# Altium footprint library PCB1.PcbLib: 98 footprints (part 6 of 7)
Each footprint in its own frame and in the unit in brackets; x right, y up, seen from the top. Pads: shape width x height; smd on the part's side, far side on the other; paste and mask are expansions set on the pad; w line width, h text height; cw(c..) or ccw(c..) is an arc to the next point about the centre after c.
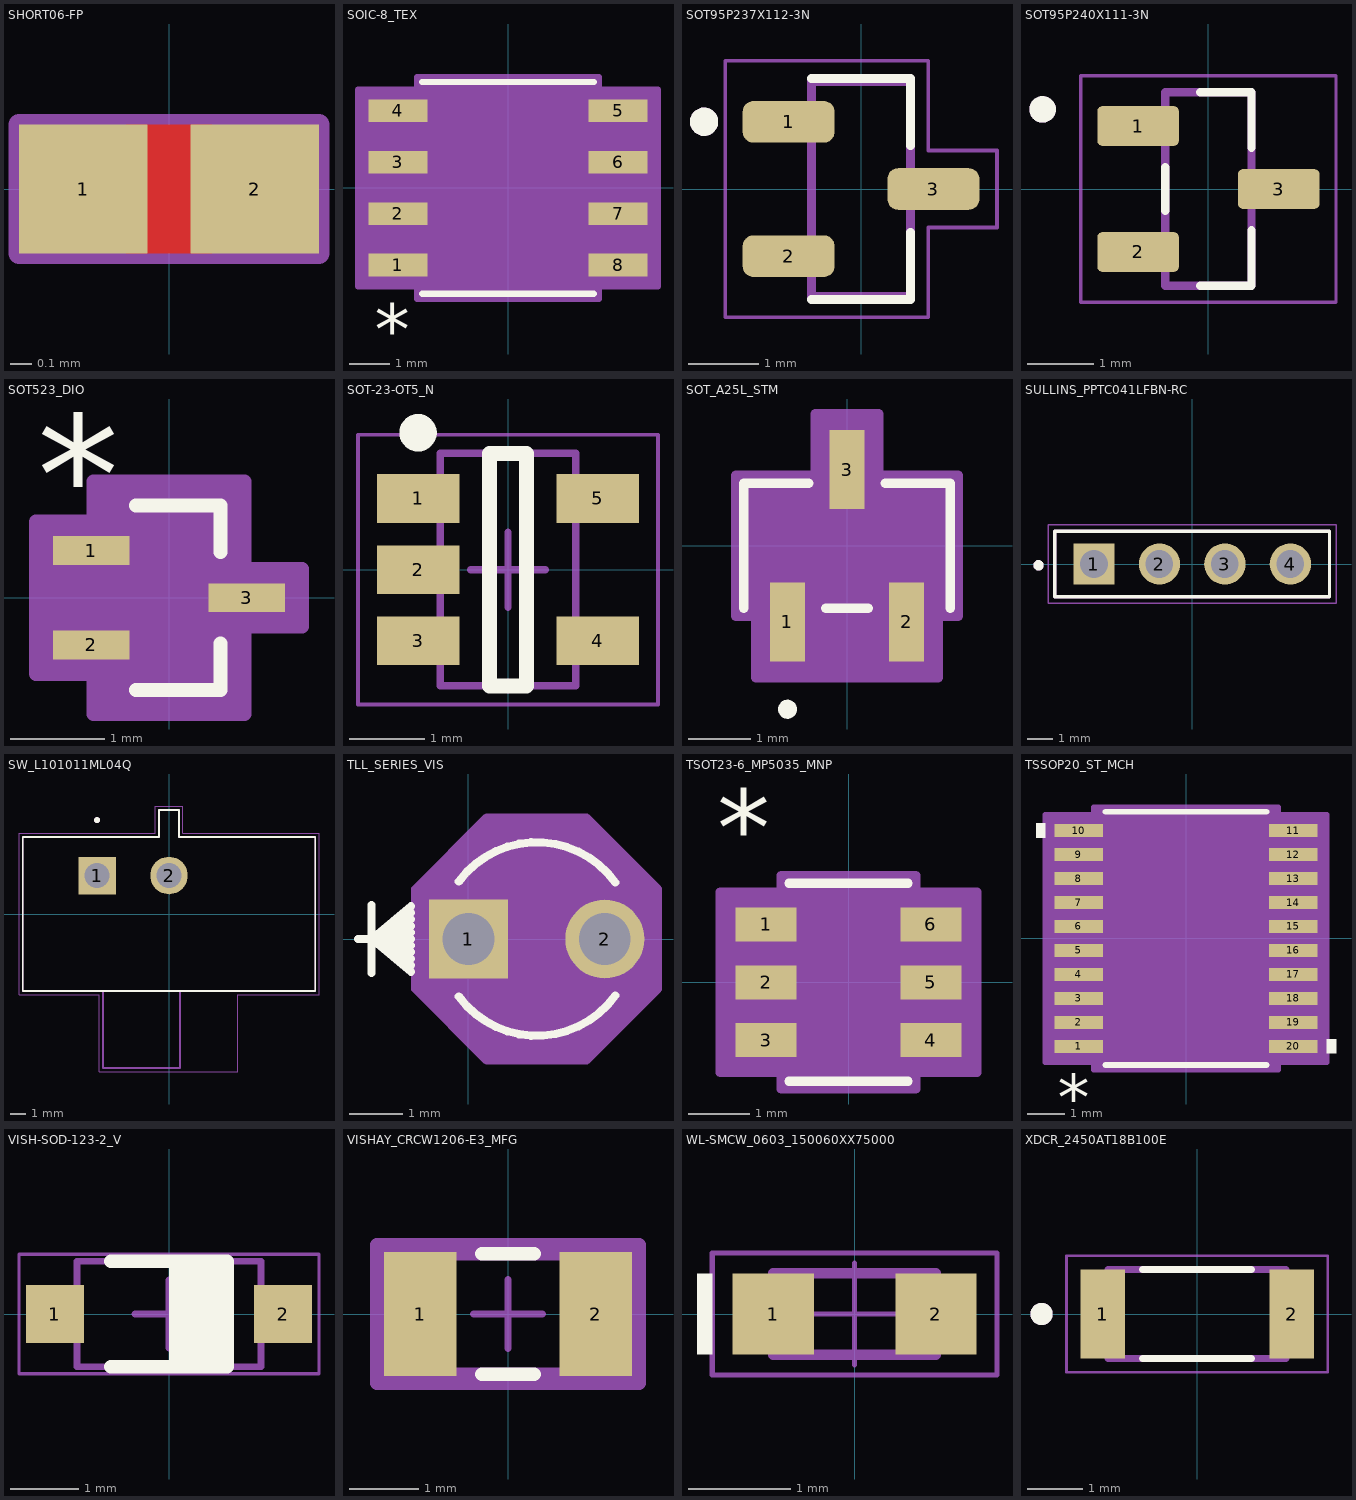
[diagram p5: the footprints below, top view; thin cyan lines are the x and y axes]

## SHORT06-FP [mm]
pads (2):
  rect 0.6x0.6 smd paste-0.4 mask+0.102: 1(-0.4,0) 2(0.4,0)
Top Layer:
  region: -0.2,0.3 -0.2,-0.3 0.2,-0.3 0.2,0.3
Top Assembly:
  lines w0.1: -0.7,-0.3 0.7,-0.3 0.7,0.3 -0.7,0.3 -0.7,-0.3

## SOIC-8_TEX [mil]
pads (8):
  rect 57.5x22 smd paste+0 mask+0: 1(-107.25,-75) 2(-107.25,-25) 3(-107.25,25) 4(-107.25,75) 5(107.25,75) 6(107.25,25) 7(107.25,-25) 8(107.25,-75)
Top Overlay:
  lines w6: -83.5,-103 83.5,-103 ; -83.5,103 83.5,103
  text "*" at -129.75,-92 h50
Top 3D Body:
  lines w0: -12,-98 cw(c0,-98) 12,-98
  lines w1: -122,-85 -78.5,-85 -78.5,-65 -122,-65 -122,-85 ; -122,-35 -78.5,-35 -78.5,-15 -122,-15 -122,-35 ; -122,15 -78.5,15 -78.5,35 -122,35 -122,15 ; -122,65 -78.5,65 -78.5,85 -122,85 -122,65 ; -78.5,-98 78.5,-98 78.5,98 -78.5,98 -78.5,-98 ; 78.5,-85 78.5,-65 122,-65 122,-85 78.5,-85 ; 78.5,-35 78.5,-15 122,-15 122,-35 78.5,-35 ; 78.5,15 78.5,35 122,35 122,15 78.5,15 ; 78.5,65 78.5,85 122,85 122,65 78.5,65
Top Courtyard:
  region: -88.5,96 -146,96 -146,-96 -88.5,-96 -88.5,-108 88.5,-108 88.5,-96 146,-96 146,96 88.5,96 88.5,108 -88.5,108
  lines w6: -146,-96 -146,96 -88.5,96 -88.5,108 88.5,108 88.5,96 146,96 146,-96 88.5,-96 88.5,-108 -88.5,-108 -88.5,-96 -146,-96
3D body "SOIC-8_TEX.step": height 69.09, standoff 0, extent -122.01,-97.99 122.01,97.99

## SOT95P237X112-3N [mm]
pads (3):
  rrect50% 1.3x0.59 smd: 1(-1.025,0.95) 2(-1.025,-0.95) 3(1.025,0)
Top Overlay:
  circle w0.2: c-2.222,0.953 r0.1
  lines w0.127: -0.7,-1.565 0.7,-1.565 0.7,-0.615 ; -0.7,1.565 0.7,1.565 0.7,0.615
Top 3D Body:
  circle w0.2: c-2.222,0.953 r0.1
  lines w0.127: -0.7,-1.52 -0.7,1.52 0.7,1.52 0.7,-1.52 -0.7,-1.52
Top Courtyard:
  lines w0.05: -1.925,-1.815 0.95,-1.815 0.95,-0.545 1.925,-0.545 1.925,0.545 0.95,0.545 0.95,1.815 -1.925,1.815 -1.925,-1.815
3D body "step_temp.STEP": height 1.12, standoff 0, extent -1.255,-1.46 1.255,1.46

## SOT95P240X111-3N [mm]
pads (3):
  rrect25% 1.23x0.6 smd paste+0 mask+0.102: 1(-1.06,0.95) 2(-1.06,-0.95) 3(1.06,0)
Top Overlay:
  circle w0.2: c-2.5,1.2 r0.1
  lines w0.127: -0.65,-0.33 -0.65,0.33 ; -0.125,-1.46 0.65,-1.46 0.65,-0.62 ; -0.125,1.46 0.65,1.46 0.65,0.62
Top 3D Body:
  circle w0.2: c-2.5,1.2 r0.1
  lines w0.127: -0.65,-1.46 -0.65,1.46 0.65,1.46 0.65,-1.46 -0.65,-1.46
Top Courtyard:
  lines w0.05: -1.925,-1.71 1.925,-1.71 1.925,1.71 -1.925,1.71 -1.925,-1.71
3D body "step_temp.STEP": height 1.2, standoff -0.1, extent -1.3,-1.516 1.3,1.524

## SOT523_DIO [mil]
pads (3):
  rect 32x12 smd paste+0 mask+0: 1(-32.5,19.68) 2(-32.5,-19.68) 3(32.5,0)
Top Overlay:
  lines w6: -13.78,-38.5 21.5,-38.5 21.5,-19.1 ; -13.78,38.5 21.5,38.5 21.5,19.1
  text "*" at -55,26.68 h50
Top 3D Body:
  lines w1: -12,33.5 ccw(c0,33.5) 12,33.5 ; -34.5,-25.68 -34.5,-13.69 -16.5,-13.69 -16.5,-25.68 -34.5,-25.68 ; -34.5,13.69 -34.5,25.68 -16.5,25.68 -16.5,13.69 -34.5,13.69 ; -16.5,-33.5 16.5,-33.5 16.5,33.5 -16.5,33.5 -16.5,-33.5 ; 16.5,-6 16.5,6 34.5,6 34.5,-6 16.5,-6
Top Courtyard:
  region: 31.5,-48.5 -31.5,-48.5 -31.5,-31.68 -55.5,-31.68 -55.5,31.68 -31.5,31.68 -31.5,48.5 31.5,48.5 31.5,12 55.5,12 55.5,-12 31.5,-12
  lines w6: -55.5,-31.68 -31.5,-31.68 -31.5,-48.5 31.5,-48.5 31.5,-12 55.5,-12 55.5,12 31.5,12 31.5,48.5 -31.5,48.5 -31.5,31.68 -55.5,31.68 -55.5,-31.68
3D body "SOT523_DIO.step": height 35.12, standoff 0, extent -34.49,-33.5 34.49,33.5

## SOT-23-OT5_N [mm]
pads (5):
  rect 1.1x0.65 smd: 1(-1.2,0.95) 2(-1.2,0) 3(-1.2,-0.95) 4(1.2,-0.95) 5(1.2,0.95)
Top Overlay:
  circle w0.25: c-1.2,1.825 r0.125
  lines w0.2: -0.25,-1.55 0.25,-1.55 0.25,1.55 -0.25,1.55 -0.25,-1.55
Top 3D Body:
  lines w0.1: -0.9,-1.55 -0.9,1.55 0.9,1.55 0.9,-1.55 -0.9,-1.55
Top Courtyard:
  lines w0.05: -2,-1.8 -2,1.8 2,1.8 2,-1.8 -2,-1.8
  lines w0.1: -0.5,0 0.5,0 ; 0,-0.5 0,0.5
3D body: height 1.45, standoff 0, extent -0.9,-1.55 0.9,1.55

## SOT_A25L_STM [mil]
pads (3):
  rect 22x50 smd paste+0 mask+0: 1(-37.5,-48) 2(37.5,-48) 3(0,48)
Top Overlay:
  circle w6: c-37.5,-103 r3
  lines w6: -65,-39.5 -65,39.5 -24.1,39.5 ; -13.4,-39.5 13.4,-39.5 ; 24.1,39.5 65,39.5 65,-39.5
Top 3D Body:
  circle w0: c-37.5,-24.5 r3
  lines w1: -60,-34.5 -60,34.5 60,34.5 60,-34.5 -60,-34.5 ; -47.5,-59 -27.5,-59 -27.5,-34.5 -47.5,-34.5 -47.5,-59 ; -10,34.5 -10,59 10,59 10,34.5 -10,34.5 ; 27.5,-59 47.5,-59 47.5,-34.5 27.5,-34.5 27.5,-59
Top Courtyard:
  region: -70,-44.5 -70,44.5 -20,44.5 -20,83 20,83 20,44.5 70,44.5 70,-44.5 57.5,-44.5 57.5,-83 -57.5,-83 -57.5,-44.5
  lines w6: -70,-44.5 -57.5,-44.5 -57.5,-83 57.5,-83 57.5,-44.5 70,-44.5 70,44.5 20,44.5 20,83 -20,83 -20,44.5 -70,44.5 -70,-44.5
3D body "SOT_A25L_STM.step": height 55.12, standoff 0, extent -60,-59.02 60,59.02

## SULLINS_PPTC041LFBN-RC [mm]
pads (4):
  rect 1.605x1.605 / inner round 1.605 / far side rect 1.605x1.605 hole 1.07: 1(-3.81,0)
  round 1.605 hole 1.07: 2(-1.27,0) 3(1.27,0) 4(3.81,0)
Top Overlay:
  circle w0.2: c-5.96,-0.05 r0.1
  lines w0.127: -5.33,-1.27 5.33,-1.27 5.33,1.27 -5.33,1.27 -5.33,-1.27
Top 3D Body:
  circle w0.2: c-5.96,-0.05 r0.1
  lines w0.127: -5.33,-1.27 -5.33,1.27 5.33,1.27 5.33,-1.27 -5.33,-1.27
Top Courtyard:
  lines w0.05: -5.58,-1.52 -5.58,1.52 5.58,1.52 5.58,-1.52 -5.58,-1.52
3D body "step_temp.STEP": height 8.51, standoff -3.2, extent -5.334,-1.27 5.334,1.27

## SW_L101011ML04Q [mm]
pads (2):
  rect 2.475x2.475 / inner round 2.475 / far side rect 2.475x2.475 hole 1.65: 1(-4.75,2.54)
  round 2.475 hole 1.65: 2(0,2.54)
Top Overlay:
  circle w0.2: c-4.75,6.2 r0.1
  lines w0.127: -9.65,-5.08 9.65,-5.08 9.65,5.08 0.65,5.08 0.65,6.86 -0.65,6.86 -0.65,5.08 -9.65,5.08 -9.65,-5.08
Top 3D Body:
  circle w0.2: c-4.75,6.2 r0.1
  lines w0.127: -4.35,-5.08 -4.35,-10.16 0.73,-10.16 0.73,-5.08 ; -4.35,-5.08 0.73,-5.08 ; -4.35,-5.08 -9.65,-5.08 -9.65,5.08 -0.65,5.08 -0.65,6.86 0.65,6.86 0.65,5.08 9.65,5.08 9.65,-5.08 0.73,-5.08
Top Courtyard:
  lines w0.05: -9.9,-5.33 -4.6,-5.33 -4.6,-10.41 4.54,-10.41 4.54,-5.33 9.9,-5.33 9.9,5.33 0.9,5.33 0.9,7.11 -0.9,7.11 -0.9,5.33 -9.9,5.33 -9.9,-5.33
3D body "step_temp.STEP": height 10.46, standoff -3.96, extent -9.652,-7.62 9.652,9.398

## TLL_SERIES_VIS [mil]
pads (2):
  rect 58x58 / inner round 60 / far side rect 58x58 hole 38 paste-99999 mask+0: 1(0,0)
  round 58 / inner round 60 / far side round 58 hole 38 paste-99999 mask+0: 2(100,0)
Top Overlay:
  lines w6: -81,0 -42.1,0 ; -71,-25 -71,25 ; -42.1,-24.08 -71,0 ; -42.1,-19.27 -71,0 ; -42.1,-14.45 -71,0 ; -42.1,-9.63 -71,0 ; -42.1,-4.82 -71,0 ; -42.1,4.82 -71,0 ; -42.1,9.63 -71,0 ; -42.1,14.45 -71,0 ; -42.1,19.27 -71,0 ; -42.1,24.08 -71,0 ; -7.17,-42.1 ccw(c50,0) 107.69,-41.39 ; -7.17,42.1 cw(c50,0) 107.69,41.39
Top 3D Body:
  circle w0: c50,0 r66
  lines w1: -81,0 -31,0 ; -71,-25 -71,25 ; -41,-20 -71,0 ; -41,-15 -71,0 ; -41,-10 -71,0 ; -41,-5 -71,0 ; -41,5 -71,0 ; -41,10 -71,0 ; -41,15 -71,0 ; -41,20 -71,0 ; -71,0 -41,-25 -41,25 -71,0
Top Courtyard:
  region: -39,-36.65 13.35,-89 86.65,-89 139,-36.65 139,36.65 86.65,89 13.35,89 -39,36.65
  lines w6: -39,-36.65 -39,36.65 13.35,89 86.65,89 139,36.65 139,-36.65 86.65,-89 13.35,-89 -39,-36.65
3D body "80443LED_3mm_TLHG440.stp": height 873.23, standoff -481.1, extent -12.53,-65.98 112.53,60

## TSOT23-6_MP5035_MNP [mil]
pads (6):
  rect 39.5x22 smd paste+0 mask+0: 1(-53.25,37.4) 2(-53.25,0) 3(-53.25,-37.4) 4(53.25,-37.4) 5(53.25,0) 6(53.25,37.4)
Top Overlay:
  lines w6: -38.5,-64 38.5,-64 ; -38.5,64 38.5,64
  text "*" at -85,75 h50
Top 3D Body:
  lines w1: -12,59 ccw(c0,59) 12,59 ; -59,-47.4 -33.5,-47.4 -33.5,-27.4 -59,-27.4 -59,-47.4 ; -59,-10 -33.5,-10 -33.5,10 -59,10 -59,-10 ; -59,27.4 -33.5,27.4 -33.5,47.4 -59,47.4 -59,27.4 ; -33.5,-59 -33.5,59 33.5,59 33.5,-59 -33.5,-59 ; 33.5,-47.4 59,-47.4 59,-27.4 33.5,-27.4 33.5,-47.4 ; 33.5,-10 59,-10 59,10 33.5,10 33.5,-10 ; 33.5,27.4 59,27.4 59,47.4 33.5,47.4 33.5,27.4
Top Courtyard:
  region: -43.5,-58.4 -83,-58.4 -83,58.4 -43.5,58.4 -43.5,69 43.5,69 43.5,58.4 83,58.4 83,-58.4 43.5,-58.4 43.5,-69 -43.5,-69
  lines w6: -83,-58.4 -43.5,-58.4 -43.5,-69 43.5,-69 43.5,-58.4 83,-58.4 83,58.4 43.5,58.4 43.5,69 -43.5,69 -43.5,58.4 -83,58.4 -83,-58.4
3D body "TSOT23-6_MP5035_MNP.step": height 39.09, standoff 0, extent -59.02,-59.02 59.02,59.02

## TSSOP20_ST_MCH [mil]
pads (20):
  rect 51.5x14 smd paste+0 mask+0: 1(-114.25,-115.16) 2(-114.25,-89.57) 3(-114.25,-63.98) 4(-114.25,-38.39) 5(-114.25,-12.8) 6(-114.25,12.8) 7(-114.25,38.39) 8(-114.25,63.98) 9(-114.25,89.57) 10(-114.25,115.16) 11(114.25,115.16) 12(114.25,89.57) 13(114.25,63.98) 14(114.25,38.39) 15(114.25,12.8) 16(114.25,-12.8) 17(114.25,-38.39) 18(114.25,-63.98) 19(114.25,-89.57) 20(114.25,-115.16)
Top Overlay:
  region: -150,107.66 -160,107.66 -160,122.66 -150,122.66
  region: 150,-122.66 160,-122.66 160,-107.66 150,-107.66
  lines w6: -85.92,-135 85.92,-135 ; -85.92,135 85.92,135
  text "*" at -136.75,-124.16 h50
Top 3D Body:
  lines w0: -12,-130 cw(c0,-130) 12,-130
  lines w1: -126,-121.16 -88.5,-121.16 -88.5,-109.16 -126,-109.16 -126,-121.16 ; -126,-95.57 -88.5,-95.57 -88.5,-83.57 -126,-83.57 -126,-95.57 ; -126,-69.98 -88.5,-69.98 -88.5,-57.98 -126,-57.98 -126,-69.98 ; -126,-44.39 -88.5,-44.39 -88.5,-32.39 -126,-32.39 -126,-44.39 ; -126,-18.8 -88.5,-18.8 -88.5,-6.8 -126,-6.8 -126,-18.8 ; -126,6.8 -88.5,6.8 -88.5,18.8 -126,18.8 -126,6.8 ; -126,32.39 -88.5,32.39 -88.5,44.39 -126,44.39 -126,32.39 ; -126,57.98 -88.5,57.98 -88.5,69.98 -126,69.98 -126,57.98 ; -126,83.57 -88.5,83.57 -88.5,95.57 -126,95.57 -126,83.57 ; -126,109.16 -88.5,109.16 -88.5,121.16 -126,121.16 -126,109.16 ; -88.5,-130 88.5,-130 88.5,130 -88.5,130 -88.5,-130 ; 88.5,-121.16 88.5,-109.16 126,-109.16 126,-121.16 88.5,-121.16 ; 88.5,-95.57 88.5,-83.57 126,-83.57 126,-95.57 88.5,-95.57 ; 88.5,-69.98 88.5,-57.98 126,-57.98 126,-69.98 88.5,-69.98 ; 88.5,-44.39 88.5,-32.39 126,-32.39 126,-44.39 88.5,-44.39 ; 88.5,-18.8 88.5,-6.8 126,-6.8 126,-18.8 88.5,-18.8 ; 88.5,6.8 88.5,18.8 126,18.8 126,6.8 88.5,6.8 ; 88.5,32.39 88.5,44.39 126,44.39 126,32.39 88.5,32.39 ; 88.5,57.98 88.5,69.98 126,69.98 126,57.98 88.5,57.98 ; 88.5,83.57 88.5,95.57 126,95.57 126,83.57 88.5,83.57 ; 88.5,109.16 88.5,121.16 126,121.16 126,109.16 88.5,109.16
Top Courtyard:
  region: -98.5,132.16 -150,132.16 -150,-132.16 -98.5,-132.16 -98.5,-140 98.5,-140 98.5,-132.16 150,-132.16 150,132.16 98.5,132.16 98.5,140 -98.5,140
  lines w6: -150,-132.16 -150,132.16 -98.5,132.16 -98.5,140 98.5,140 98.5,132.16 150,132.16 150,-132.16 98.5,-132.16 98.5,-140 -98.5,-140 -98.5,-132.16 -150,-132.16
3D body "TSSOP20_ST_MCH.step": height 47.09, standoff 0, extent -125.98,-130 125.98,130

## VISH-SOD-123-2_V [mm]
pads (2):
  rect 0.85x0.85 smd: 1(-1.675,0) 2(1.675,0)
Top Overlay:
  rectangle: 0.002,-0.771 0.852,0.779
  lines w0.2: -0.85,-0.775 0.85,-0.775 0.85,0.775 -0.85,0.775
Top 3D Body:
  lines w0.1: -1.35,-0.775 -1.35,0.775 1.35,0.775 1.35,-0.775 -1.35,-0.775
Top Courtyard:
  lines w0.05: -2.2,-0.875 -2.2,0.875 2.2,0.875 2.2,-0.875 -2.2,-0.875
  lines w0.1: -0.5,0 0.5,0 ; 0,-0.5 0,0.5
3D body: height 1.35, standoff 0.1, extent -1.35,-0.775 1.35,0.775

## VISHAY_CRCW1206-E3_MFG [mm]
pads (2):
  rect 1.05x1.8 smd paste+0 mask+0: 1(-1.275,0) 2(1.275,0)
Top Overlay:
  lines w0.2: -0.375,-0.875 0.375,-0.875 ; -0.375,0.875 0.375,0.875
Mechanical 10:
  lines w0.2: -1.9,-1 -1.9,1 1.9,1 1.9,-1 -1.9,-1
Bottom Designator:
  lines w0.2: -1.65,-0.875 -1.65,0.875 1.65,0.875 1.65,-0.875 -1.65,-0.875
Top Courtyard:
  lines w0.1: -0.5,0 0.5,0 ; 0,-0.5 0,0.5
  lines w0.2: -1.9,-1 -1.9,1 1.9,1 1.9,-1 -1.9,-1
3D body "Res_Vishay_CRCW12062R15FNEB_eec.STEP": height 0.25, standoff 0, extent -1.9,-1 1.9,1

## WL-SMCW_0603_150060XX75000 [mm]
pads (2):
  rect 0.8x0.8 smd mask+0.1: 1(-0.8,0) 2(0.8,0)
Top Overlay:
  rectangle: -1.55,-0.4 -1.4,0.4
Top Component Outline:
  rectangle: -0.8,-0.399 -0.5,0.401
  lines w0.1: -0.8,-0.4 0.8,-0.4 0.8,0.4 -0.8,0.4 -0.8,-0.4
Top Courtyard:
  lines w0.05: -1.4,-0.6 1.4,-0.6 1.4,0.6 -1.4,0.6 -1.4,-0.6
Top Component Center:
  lines w0.05: -0.5,0 0.5,0 ; 0,-0.5 0,0.5
3D body "150060xxx.stp": height 0.7, standoff 0, extent -0.8,-0.4 0.8,0.4

## XDCR_2450AT18B100E [mm]
pads (2):
  rect 0.8x1.6 smd: 1(-1.7,0) 2(1.7,0)
Top Overlay:
  circle w0.2: c-2.8,0 r0.1
  lines w0.127: -0.98,-0.8 0.98,-0.8 ; -0.98,0.8 0.98,0.8
Top 3D Body:
  circle w0.2: c-2.8,0 r0.1
  lines w0.127: -1.6,-0.8 -1.6,0.8 1.6,0.8 1.6,-0.8 -1.6,-0.8
Top Courtyard:
  lines w0.05: -2.35,-1.05 2.35,-1.05 2.35,1.05 -2.35,1.05 -2.35,-1.05
3D body "step_temp.STEP": height 0.7, standoff -0.7, extent -1.6,-0.8 1.6,0.8